# Altium footprint library con-amp.PCBLIB: 295 footprints (part 10 of 19)
Each footprint in its own frame and in the unit in brackets; x right, y up, seen from the top. Pads: shape width x height; smd on the part's side, far side on the other; paste and mask are expansions set on the pad; w line width, h text height; cw(c..) or ccw(c..) is an arc to the next point about the centre after c.
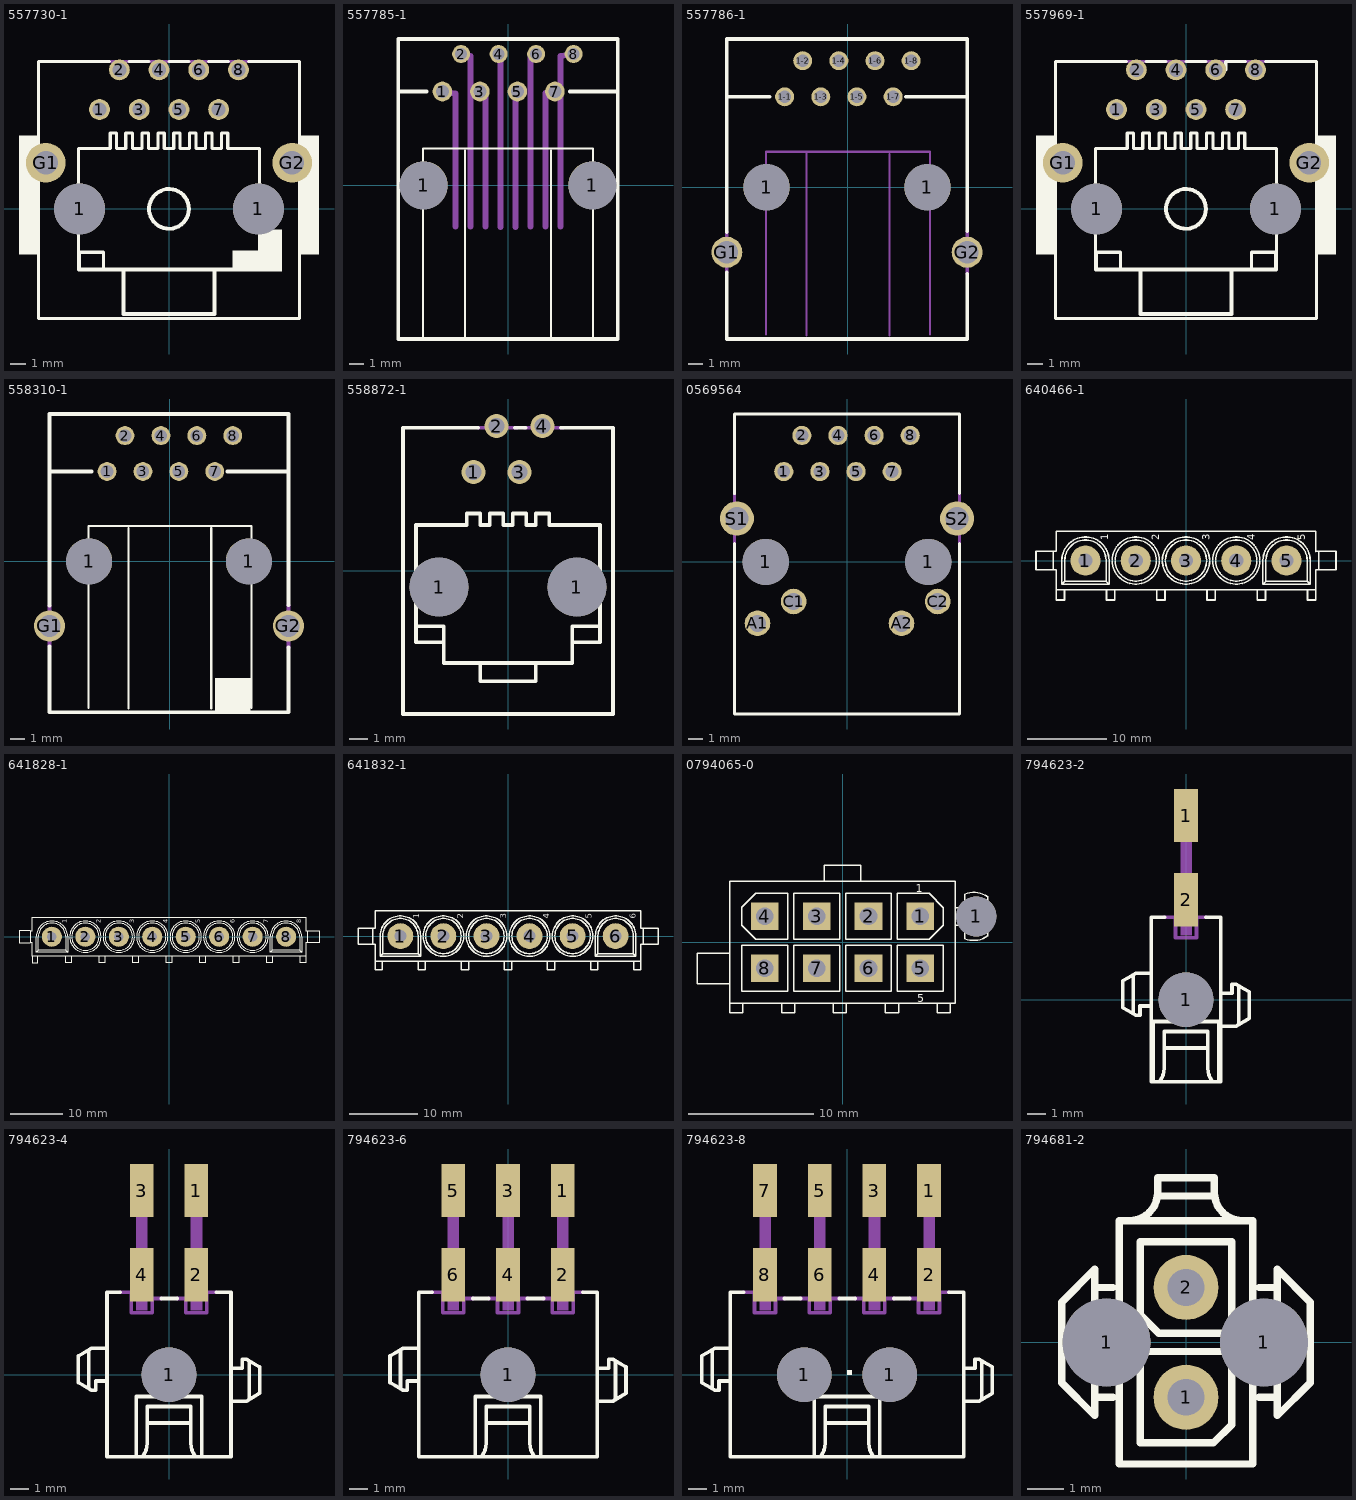
[diagram p9: the footprints below, top view; thin cyan lines are the x and y axes]

## 557730-1 [mil]
pads (12):
  round 128 hole 128: 1(-225,0) 1(225,0)
  round 52.5 hole 35: 1(-175,250) 2(-125,350) 3(-75,250) 4(-25,350) 5(25,250) 6(75,350) 7(125,250) 8(175,350)
  round 100 hole 60: G1(-310,116) G2(310,116)
Top Overlay:
  circle w10: c0,0 r50
  rectangle: -377.56,-114.61 -326.38,184.61
  rectangle: 326.38,-114.61 377.56,184.61
  rectangle: 160,-157 232,-105
  rectangle: 230,-157 284,-52
  lines w8: -165,-152 -165,-109 -228,-109 -228,152 -148,152 -148,191 -132,191 -132,152 -109,152 -109,191 -92,191 -92,152 -68,152 -68,191 -52,191 -52,152 -28,152 -28,191 -12,191 -12,152 12,152 12,191 28,191 28,152 52,152 52,191 68,191 68,152 92,152 92,191 108,191 108,152 132,152 132,191 148,191 148,152 228,152 228,-109 ; -150,371.02 -328.35,371.02 -328.35,-276.02 328.35,-276.02 328.35,371.02 200,371.02 ; -100,371.02 -50,371.02 ; 0,371.02 50,371.02 ; 100,371.02 150,371.02
  lines w10: -227,-110 -227,-152 227,-152 227,-111 ; -115,-154 -115,-264 115,-264 115,-154
Mechanical 16:
  lines w8: -150,371.02 -100,371.02 ; -50,371.02 0,371.02 ; 50,371.02 100,371.02 ; 150,371.02 200,371.02

## 557785-1 [mil]
pads (10):
  round 128 hole 128: 1(-225,0) 1(225,0)
  round 52.5 hole 35: 1(-175,250) 3(-75,250) 5(25,250) 7(125,250)
  round 48 hole 32: 2(-125,350) 4(-25,350) 6(75,350) 8(175,350)
Top Overlay:
  lines w6: -227,-408 -227,98 227,98 227,-408 ; -115,-410 -115,93 ; 115,-410 115,92
  lines w10: -217,250 -293,250 ; 165,250 293,250 ; -293,250 -293,390 293,390 293,250 ; -293,250 -293,-410 -115,-410 115,-410 293,-410 293,250
Mechanical 16:
  lines w16: -175,250 -140,245 -140,-110 ; -125,349 -100,345 -100,-110 ; -75,250 -60,247 ; -60,-110 -60,245 ; -25,350 -20,349 ; -20,-111 -20,345 ; 20,-111 20,245 ; 20,248 25,250 ; 60,-110 60,345 ; 60,347 75,350 ; 100,-110 100,245 ; 100,246 125,250 ; 140,-110 140,345 175,350

## 557786-1 [mil]
pads (12):
  round 128 hole 128: 1(-225,0) 1(220,0)
  round 52.5 hole 35: 1-1(-175,250) 1-2(-125,350) 1-3(-75,250) 1-4(-25,350) 1-5(25,250) 1-6(75,350) 1-7(125,250) 1-8(175,350)
  round 86 hole 62: G1(-335,-180) G2(330,-180)
Top Overlay:
  lines w10: -335,-236 -335,-420 330,-420 330,-239 ; -335,-124 -335,250 ; -217,250 -335,250 ; 160,250 330,250 ; 330,-122 330,250 ; -335,250 -335,410 330,410 330,250
Mechanical 16:
  lines w6: -227,-408 -227,98 227,98 227,-408 ; -115,-410 -115,93 ; 115,-410 115,92
  lines w10: -335,-235 -335,-124 ; 330,-240 330,-122

## 557969-1 [mil]
pads (12):
  round 128 hole 128: 1(-225,0) 1(225,0)
  round 52.5 hole 35: 1(-175,250) 2(-125,350) 3(-75,250) 4(-25,350) 5(25,250) 6(75,350) 7(125,250) 8(175,350)
  round 100 hole 60: G1(-310,116) G2(310,116)
Top Overlay:
  circle w10: c0,0 r50
  rectangle: -377.56,-114.61 -326.38,184.61
  rectangle: 326.38,-114.61 377.56,184.61
  lines w8: -165,-152 -165,-109 -228,-109 -228,152 -148,152 -148,191 -132,191 -132,152 -109,152 -109,191 -92,191 -92,152 -68,152 -68,191 -52,191 -52,152 -28,152 -28,191 -12,191 -12,152 12,152 12,191 28,191 28,152 52,152 52,191 68,191 68,152 92,152 92,191 108,191 108,152 132,152 132,191 148,191 148,152 228,152 228,-109 165,-109 165,-152 ; -150,371.02 -328.35,371.02 -328.35,-276.02 328.35,-276.02 328.35,371.02 200,371.02 ; -100,371.02 -50,371.02 ; 0,371.02 50,371.02 ; 100,350 100,371.02 150,371.02
  lines w10: -227,-110 -227,-152 227,-152 227,-111 ; -115,-154 -115,-264 115,-264 115,-154
Mechanical 16:
  lines w8: -150,371.02 -100,371.02 ; -50,371.02 0,371.02 ; 50,371.02 100,371.02 ; 150,371.02 200,371.02

## 558310-1 [mil]
pads (12):
  round 128 hole 128: 1(-225,0) 1(220,0)
  round 52.5 hole 35: 1(-175,250) 2(-125,350) 3(-75,250) 4(-25,350) 5(25,250) 6(75,350) 7(125,250) 8(175,350)
  round 86 hole 62: G1(-335,-180) G2(330,-180)
Top Overlay:
  rectangle: 125,-425 225,-325
  lines w6: -227,-408 -227,98 227,98 227,-408 ; -115,-410 -115,93 ; 115,-410 115,92
  lines w10: -335,-236 -335,-420 330,-420 330,-239 ; -335,-124 -335,250 ; -217,250 -335,250 ; 160,250 330,250 ; 330,-122 330,250 ; -335,250 -335,410 330,410 330,250
Mechanical 16:
  lines w10: -335,-235 -335,-124 ; 330,-240 330,-122

## 558872-1 [mil]
pads (6):
  round 128 hole 128: 1(-150,-35) 1(150,-35)
  round 52.5 hole 35: 1(-75,215) 2(-25,315) 3(25,215) 4(75,315)
Top Overlay:
  lines w8: -65,311.02 -228.35,311.02 -228.35,-311.02 228.35,-311.02 228.35,311.02 115,311.02 ; 15,311.02 38.35,311.02 ; -200,-120 -200,100 -90,100 -90,125 -60,125 -60,100 -40,100 -40,125 -10,125 -10,100 10,100 10,125 40,125 40,100 60,100 60,125 90,125 90,100 200,100 200,-120 ; -200,-120 -200,-155 -140,-155 ; -200,-120 -140,-120 -140,-155 ; -140,-155 -140,-200 -60,-200 ; -60,-200 60,-200 ; -60,-200 -60,-240 60,-240 60,-200 ; 60,-200 140,-200 140,-155 ; 140,-155 200,-155 200,-120 ; 140,-155 140,-120 200,-120
Mechanical 16:
  lines w8: -65,311.02 20,311.02 ; 35,311.02 120,311.02

## 0569564 [mil]
pads (16):
  round 127.95 hole 127.95: 1(-225,0) 1(225,0)
  round 53.15 hole 35.43: 1(-175,250) 2(-125,350) 3(-75,250) 4(-25,350) 5(25,250) 6(75,350) 7(125,250) 8(175,350)
  round 70.86 hole 47.24: A1(-247.83,-170.08) A2(150.98,-170.08) C1(-147.83,-109.84) C2(250.98,-109.84)
  round 94.48 hole 62.99: S1(-304.92,120.08) S2(304.92,120.08)
Top Overlay:
  lines w8: -311.02,50.79 -311.02,-421.26 311.02,-421.26 311.02,51.18 ; -311.02,188.58 -311.02,409.45 311.02,409.45 311.02,188.98
Mechanical 16:
  lines w8: -311.02,51.18 -311.02,188.98 ; 311.02,51.18 311.02,188.98

## 640466-1 [mil]
pads (5):
  round 150 hole 70.87: 1(-500,0) 2(-250,0) 3(0,0) 4(250,0) 5(500,0)
Top Overlay:
  lines w8: -660.43,-46.26 -746.06,-46.26 -746.06,46.26 -660.43,46.26 ; -645.67,-146.65 -645.67,-195.87 -604.33,-195.87 -604.33,-149.61 ; -617.49,0 -617.49,-117.5 ; -617.5,2.5 cw(c-500,-0.21) -382.51,2.5 -382.51,0 ; -602.49,0 -602.49,-102.5 ; -602.5,2.5 cw(c-500,-0.1) -397.51,2.5 -397.51,0 -397.49,-102.5 ; -395.67,-148.62 -395.67,-195.87 -354.33,-195.87 -354.33,-148.62 ; -367.49,-2.5 ccw(c-249.99,0.21) -132.49,-2.5 ; -367.51,2.5 cw(c-250.01,-0.21) -132.51,2.5 ; -352.49,-2.5 ccw(c-249.99,0.17) -147.49,-2.5 ; -352.51,2.5 cw(c-250.01,-0.17) -147.51,2.5 ; -145.67,-148.62 -145.67,-195.87 -104.33,-195.87 -104.33,-148.62 ; -117.49,-2.5 ccw(c0.01,0.21) 117.51,-2.5 ; -117.51,2.5 cw(c-0.01,-0.21) 117.49,2.5 ; -102.49,-2.5 ccw(c0.01,0.17) 102.51,-2.5 ; -102.51,2.5 cw(c-0.01,-0.17) 102.49,2.5 ; 104.33,-148.62 104.33,-195.87 145.67,-195.87 145.67,-148.62 ; 132.51,-2.5 ccw(c250.01,0.21) 367.51,-2.5 ; 132.49,2.5 cw(c249.99,-0.21) 367.49,2.5 ; 147.51,-2.5 ccw(c250.01,0.17) 352.51,-2.5 ; 147.49,2.5 cw(c249.99,-0.17) 352.49,2.5 ; 354.33,-148.62 354.33,-195.87 395.67,-195.87 395.67,-148.62 ; 602.5,0 602.5,-102.5 ; 602.49,2.5 ccw(c499.99,-0.17) 397.49,2.5 397.49,0 397.51,-102.5 ; 604.33,-150.59 604.33,-195.87 645.67,-195.87 645.67,-147.64 ; 617.5,0 617.5,-117.5 ; 617.49,2.5 ccw(c499.99,-0.21) 382.49,2.5 382.49,0 382.51,-117.5 ; 645.67,45.28 645.67,46.26 ; 660.43,-46.26 746.06,-46.26 746.06,46.26 660.43,46.26 ; -617.49,-117.5 -602.49,-102.5 ; -617.49,-117.5 -382.49,-117.5 ; -602.49,-102.5 -397.49,-102.5 ; -397.49,-102.5 -382.49,-117.5 ; -382.49,-117.5 -382.49,0 ; -382.49,0 -382.51,0 ; 382.51,-117.5 617.5,-117.5 ; 382.51,-117.5 397.51,-102.5 ; 397.51,-102.5 602.5,-102.5 ; 602.5,-102.5 617.5,-117.5 ; 645.67,46.26 645.67,145.67 -645.67,145.67 -645.67,46.26 -659.45,46.26 -659.45,-46.26 -645.67,-46.26 -645.67,-145.67 645.67,-145.67 645.67,-46.26 659.45,-46.26 659.45,46.26 645.67,46.26
  text "1" at -375,100 h62
  text "2" at -120,100 h62
  text "3" at 130,100 h62
  text "4" at 355,100 h62
  text "5" at 605,100 h62
Mechanical 16:
  circle w8: c500,0 r62.5
  circle w8: c-500,0 r62.51
  circle w8: c-250,0 r62.5
  circle w8: c0,0 r62.5
  circle w8: c250,0 r62.5

## 641828-1 [mil]
pads (8):
  round 150 hole 70.87: 1(-875,0) 2(-625,0) 3(-375,0) 4(-125,0) 5(125,0) 6(375,0) 7(625,0) 8(875,0)
Top Overlay:
  lines w8: -1035.43,-46.26 -1121.06,-46.26 -1121.06,46.26 -1035.43,46.26 ; -1020.67,-146.65 -1020.67,-195.87 -979.33,-195.87 -979.33,-149.61 ; -992.49,0 -992.49,-117.5 ; -992.5,2.5 cw(c-875,-0.21) -757.51,2.5 -757.51,0 ; -977.49,0 -977.49,-102.5 ; -977.5,2.5 cw(c-875,-0.1) -772.51,2.5 -772.51,0 -772.49,-102.5 ; -770.67,-148.62 -770.67,-195.87 -729.33,-195.87 -729.33,-148.62 ; -742.49,-2.5 ccw(c-624.99,0.21) -507.49,-2.5 ; -742.51,2.5 cw(c-625.01,-0.21) -507.51,2.5 ; -727.49,-2.5 ccw(c-624.99,0.17) -522.49,-2.5 ; -727.51,2.5 cw(c-625.01,-0.17) -522.51,2.5 ; -520.67,-148.62 -520.67,-195.87 -479.33,-195.87 -479.33,-148.62 ; -492.49,-2.5 ccw(c-374.99,0.21) -257.49,-2.5 ; -492.51,2.5 cw(c-375.01,-0.21) -257.51,2.5 ; -477.49,-2.5 ccw(c-374.99,0.17) -272.49,-2.5 ; -477.51,2.5 cw(c-375.01,-0.17) -272.51,2.5 ; -270.67,-148.62 -270.67,-195.87 -229.33,-195.87 -229.33,-148.62 ; -242.49,-2.5 ccw(c-124.99,0.21) -7.49,-2.5 ; -242.51,2.5 cw(c-125.01,-0.21) -7.51,2.5 ; -227.49,-2.5 ccw(c-124.99,0.17) -22.49,-2.5 ; -227.51,2.5 cw(c-125.01,-0.17) -22.51,2.5 ; -20.67,-148.62 -20.67,-195.87 20.67,-195.87 20.67,-148.62 ; 7.51,-2.5 ccw(c125.01,0.21) 242.51,-2.5 ; 7.49,2.5 cw(c124.99,-0.21) 242.49,2.5 ; 22.51,-2.5 ccw(c125.01,0.17) 227.51,-2.5 ; 22.49,2.5 cw(c124.99,-0.17) 227.49,2.5 ; 229.33,-148.62 229.33,-195.87 270.67,-195.87 270.67,-148.62 ; 257.51,-2.5 ccw(c375.01,0.21) 492.51,-2.5 ; 257.49,2.5 cw(c374.99,-0.21) 492.49,2.5 ; 272.51,-2.5 ccw(c375.01,0.17) 477.51,-2.5 ; 272.49,2.5 cw(c374.99,-0.17) 477.49,2.5 ; 479.33,-148.62 479.33,-195.87 520.67,-195.87 520.67,-148.62 ; 507.51,-2.5 ccw(c625.01,0.21) 742.51,-2.5 ; 507.49,2.5 cw(c624.99,-0.21) 742.49,2.5 ; 522.51,-2.5 ccw(c625.01,0.17) 727.51,-2.5 ; 522.49,2.5 cw(c624.99,-0.17) 727.49,2.5 ; 729.33,-148.62 729.33,-195.87 770.67,-195.87 770.67,-148.62 ; 977.5,0 977.5,-102.5 ; 977.49,2.5 ccw(c874.99,-0.17) 772.49,2.5 772.49,0 772.51,-102.5 ; 979.33,-150.59 979.33,-195.87 1020.67,-195.87 1020.67,-147.64 ; 992.5,0 992.5,-117.5 ; 992.49,2.5 ccw(c874.99,-0.21) 757.49,2.5 757.49,0 757.51,-117.5 ; 1020.67,45.28 1020.67,46.26 ; 1035.43,-46.26 1121.06,-46.26 1121.06,46.26 1035.43,46.26 ; -992.49,-117.5 -977.49,-102.5 ; -992.49,-117.5 -757.49,-117.5 ; -977.49,-102.5 -772.49,-102.5 ; -772.49,-102.5 -757.49,-117.5 ; -757.49,-117.5 -757.49,0 ; -757.49,0 -757.51,0 ; 757.51,-117.5 992.5,-117.5 ; 757.51,-117.5 772.51,-102.5 ; 772.51,-102.5 977.5,-102.5 ; 977.5,-102.5 992.5,-117.5 ; 1020.67,46.26 1020.67,145.67 -1020.67,145.67 -1020.67,46.26 -1034.45,46.26 -1034.45,-46.26 -1020.67,-46.26 -1020.67,-145.67 1020.67,-145.67 1020.67,-46.26 1034.45,-46.26 1034.45,46.26 1020.67,46.26 ; 242.51,0 242.49,0
  text "1" at -750,100 h62
  text "2" at -495,100 h62
  text "3" at -245,100 h62
  text "4" at 5,100 h62
  text "5" at 250,100 h62
  text "6" at 505,100 h62
  text "7" at 755,100 h62
  text "8" at 1005,100 h62
Mechanical 16:
  circle w8: c-125,0 r62.5
  circle w8: c-875,0 r62.51
  circle w8: c-625,0 r62.5
  circle w8: c-375,0 r62.5
  circle w8: c875,0 r62.5
  circle w8: c125,0 r62.51
  circle w8: c375,0 r62.5
  circle w8: c625,0 r62.5

## 641832-1 [mil]
pads (6):
  round 150 hole 70.87: 1(-625,0) 2(-375,0) 3(-125,0) 4(125,0) 5(375,0) 6(625,0)
Top Overlay:
  lines w8: -785.43,-46.26 -871.06,-46.26 -871.06,46.26 -785.43,46.26 ; -770.67,-146.65 -770.67,-195.87 -729.33,-195.87 -729.33,-149.61 ; -742.49,0 -742.49,-117.5 ; -742.5,2.5 cw(c-625,-0.21) -507.51,2.5 -507.51,0 ; -727.49,0 -727.49,-102.5 ; -727.5,2.5 cw(c-625,-0.1) -522.51,2.5 -522.51,0 -522.49,-102.5 ; -520.67,-148.62 -520.67,-195.87 -479.33,-195.87 -479.33,-148.62 ; -492.49,-2.5 ccw(c-374.99,0.21) -257.49,-2.5 ; -492.51,2.5 cw(c-375.01,-0.21) -257.51,2.5 ; -477.49,-2.5 ccw(c-374.99,0.17) -272.49,-2.5 ; -477.51,2.5 cw(c-375.01,-0.17) -272.51,2.5 ; -270.67,-148.62 -270.67,-195.87 -229.33,-195.87 -229.33,-148.62 ; -242.49,-2.5 ccw(c-124.99,0.21) -7.49,-2.5 ; -242.51,2.5 cw(c-125.01,-0.21) -7.51,2.5 ; -227.49,-2.5 ccw(c-124.99,0.17) -22.49,-2.5 ; -227.51,2.5 cw(c-125.01,-0.17) -22.51,2.5 ; -20.67,-148.62 -20.67,-195.87 20.67,-195.87 20.67,-148.62 ; 7.51,-2.5 ccw(c125.01,0.21) 242.51,-2.5 ; 7.49,2.5 cw(c124.99,-0.21) 242.49,2.5 ; 22.51,-2.5 ccw(c125.01,0.17) 227.51,-2.5 ; 22.49,2.5 cw(c124.99,-0.17) 227.49,2.5 ; 229.33,-148.62 229.33,-195.87 270.67,-195.87 270.67,-148.62 ; 257.51,-2.5 ccw(c375.01,0.21) 492.51,-2.5 ; 257.49,2.5 cw(c374.99,-0.21) 492.49,2.5 ; 272.51,-2.5 ccw(c375.01,0.17) 477.51,-2.5 ; 272.49,2.5 cw(c374.99,-0.17) 477.49,2.5 ; 479.33,-148.62 479.33,-195.87 520.67,-195.87 520.67,-148.62 ; 727.5,0 727.5,-102.5 ; 727.49,2.5 ccw(c624.99,-0.17) 522.49,2.5 522.49,0 522.51,-102.5 ; 729.33,-150.59 729.33,-195.87 770.67,-195.87 770.67,-147.64 ; 742.5,0 742.5,-117.5 ; 742.49,2.5 ccw(c624.99,-0.21) 507.49,2.5 507.49,0 507.51,-117.5 ; 770.67,45.28 770.67,46.26 ; 785.43,-46.26 871.06,-46.26 871.06,46.26 785.43,46.26 ; -742.49,-117.5 -727.49,-102.5 ; -742.49,-117.5 -507.49,-117.5 ; -727.49,-102.5 -522.49,-102.5 ; -522.49,-102.5 -507.49,-117.5 ; -507.49,-117.5 -507.49,0 ; -507.49,0 -507.51,0 ; 507.51,-117.5 742.5,-117.5 ; 507.51,-117.5 522.51,-102.5 ; 522.51,-102.5 727.5,-102.5 ; 727.5,-102.5 742.5,-117.5 ; 770.67,46.26 770.67,145.67 -770.67,145.67 -770.67,46.26 -784.45,46.26 -784.45,-46.26 -770.67,-46.26 -770.67,-145.67 770.67,-145.67 770.67,-46.26 784.45,-46.26 784.45,46.26 770.67,46.26 ; 492.51,0 492.49,0
  text "1" at -500,100 h62
  text "2" at -245,100 h62
  text "3" at 5,100 h62
  text "4" at 255,100 h62
  text "5" at 500,100 h62
  text "6" at 755,100 h62
Mechanical 16:
  circle w8: c125,0 r62.5
  circle w8: c-625,0 r62.51
  circle w8: c-375,0 r62.5
  circle w8: c-125,0 r62.5
  circle w8: c625,0 r62.5
  circle w8: c375,0 r62.51

## 0794065-0 [mil]
pads (9):
  rect 86.61x86.61 hole 55.12: 1(244.49,81.5) 2(81.5,81.5) 3(-81.5,81.5) 4(-244.49,81.5) 5(244.49,-81.5) 6(81.5,-81.5) 7(-81.5,-81.5) 8(-244.49,-81.5)
  round 125.98 hole 125.98: 1(419.69,81.5)
Top Overlay:
  lines w4: -153.54,-154.04 -153.54,-153.54 ; -354.33,-191.44 -313.48,-191.44 ; -354.33,-191.44 -354.33,-129.43 ; -354.33,-191.44 -354.33,-221.46 -313.48,-221.46 -313.48,-191.44 ; -354.33,-129.43 -354.33,-33.46 ; -354.33,-129.43 -456.69,-129.43 -456.69,-33.46 -354.33,-33.46 ; -354.33,-33.46 -354.33,191.44 -57.09,191.44 ; -313.48,-191.44 -191.44,-191.44 ; -191.44,-191.44 -150.59,-191.44 ; -191.44,-191.44 -191.44,-221.46 -150.59,-221.46 -150.59,-191.44 ; -153.54,-153.54 -153.54,-9.35 -9.35,-9.35 -9.35,-153.54 -153.54,-153.54 ; -150.59,-191.44 -28.54,-191.44 ; -57.09,191.44 57.09,191.44 ; -57.09,191.44 -57.09,242.62 57.09,242.62 57.09,191.44 ; -28.54,-191.44 12.3,-191.44 ; -28.54,-191.44 -28.54,-221.46 12.3,-221.46 12.3,-191.44 ; 12.3,-191.44 134.35,-191.44 ; 57.09,191.44 354.33,191.44 354.33,109.25 ; 134.35,-191.44 175.69,-191.44 ; 134.35,-191.44 134.35,-221.46 175.69,-221.46 175.69,-191.44 ; 175.69,-191.44 297.74,-191.44 ; 297.74,-191.44 338.58,-191.44 ; 297.74,-191.44 297.74,-221.46 338.58,-221.46 338.58,-191.44 ; 338.58,-191.44 354.33,-191.44 354.33,53.64 ; 354.33,53.64 354.33,109.25 ; 354.33,53.64 383.37,53.64 383.37,54.13 ; 354.33,109.25 383.37,109.25 383.37,108.76 ; 383.37,54.13 383.37,108.76 ; 383.37,54.13 383.37,11.81 ccw(c412,78.65) 455.22,20.18 455.22,142.72 ccw(c411.52,84) 383.37,151.57 383.37,108.76 ; -316.44,-153.54 -316.44,-9.35 -172.24,-9.35 -172.24,-153.54 -316.44,-153.54 ; -316.44,53.64 -272.15,9.35 -172.24,9.35 -172.24,153.54 -272.64,153.54 -316.44,109.74 -316.44,53.64 ; -153.54,9.35 -9.35,9.35 -9.35,153.54 -153.54,153.54 -153.54,9.35 ; 9.35,-153.54 9.35,-9.35 153.54,-9.35 153.54,-153.54 9.35,-153.54 ; 9.35,9.35 153.54,9.35 153.54,153.54 9.35,153.54 9.35,9.35 ; 172.24,-153.54 172.24,-9.35 316.44,-9.35 316.44,-153.54 172.24,-153.54 ; 172.24,9.35 272.15,9.35 316.44,53.64 316.44,109.25 272.15,153.54 172.24,153.54 172.24,9.35
  text "1" at 230.32,157.97 h25.1
  text "5" at 234.74,-187.5 h25.1

## 794623-2 [mm]
pads (3):
  round 3 hole 3: 1(0,0)
  rect 1.3x2.92 smd: 1(0,10.1) 2(0,5.48)
Top Overlay:
  region: 0,0 0.254,0 0.254,0.254 0,0.254
  region: 0,0 0.254,0 0.254,0.254 0,0.254
  region: 0,0 0.254,0 0.254,0.254 0,0.254
  region: 0,0 0.254,0 0.254,0.254 0,0.254
  lines w0.203: -2.9,-0.7 -2.9,1.3 ; -2,-0.35 -2.525,-0.35 -2.525,-0.85 -2.75,-0.85 -3.475,-0.425 -3.475,1.025 -2.75,1.45 -2,1.45 ; -1.8,-4.4 -1.8,-1.2 1.8,-1.2 1.8,-4.4 ; -1.425,-4.45 ccw(c-2.325,-3.775) -1.2,-3.775 -1.2,-2.65 ; -1.175,4.525 -1.9,4.525 -1.9,-4.5 1.9,-4.5 1.9,4.525 1.1,4.525 ; 1.425,-4.45 cw(c2.325,-3.775) 1.2,-3.775 1.2,-2.65 ; 2,-1.45 2.75,-1.45 3.475,-1.025 3.475,0.425 2.75,0.85 2.525,0.85 2.525,0.35 2,0.35 ; 2.9,-1.3 2.9,0.7 ; -1.2,-2.65 1.2,-2.65 ; -1.2,-2.65 -1.2,-1.75 1.2,-1.75 1.2,-2.65
Mechanical 16:
  rectangle: -0.312,3.513 0.325,11.025
  lines w0.203: -1.175,4.525 -0.575,4.525 -0.575,3.4 0.575,3.4 0.575,4.525 1.1,4.525

## 794623-4 [mm]
pads (5):
  round 3 hole 3: 1(0,0)
  rect 1.3x2.92 smd: 1(1.5,10.1) 2(1.5,5.48) 3(-1.5,10.1) 4(-1.5,5.48)
Top Overlay:
  region: 0,0 0.254,0 0.254,0.254 0,0.254
  region: 0,0 0.254,0 0.254,0.254 0,0.254
  region: 0,0 0.254,0 0.254,0.254 0,0.254
  region: 0,0 0.254,0 0.254,0.254 0,0.254
  lines w0.203: -4.4,-0.7 -4.4,1.3 ; -3.5,-0.35 -4.025,-0.35 -4.025,-0.85 -4.25,-0.85 -4.975,-0.425 -4.975,1.025 -4.25,1.45 -3.5,1.45 ; -2.675,4.525 -3.4,4.525 -3.4,-4.5 3.4,-4.5 3.4,4.525 2.6,4.525 ; -1.8,-4.4 -1.8,-1.2 1.8,-1.2 1.8,-4.4 ; -1.425,-4.45 ccw(c-2.325,-3.775) -1.2,-3.775 -1.2,-2.65 ; -0.425,4.175 0.45,4.175 ; 1.425,-4.45 cw(c2.325,-3.775) 1.2,-3.775 1.2,-2.65 ; 3.5,-1.45 4.25,-1.45 4.975,-1.025 4.975,0.425 4.25,0.85 4.025,0.85 4.025,0.35 3.5,0.35 ; 4.4,-1.3 4.4,0.7 ; -1.2,-2.65 1.2,-2.65 ; -1.2,-2.65 -1.2,-1.75 1.2,-1.75 1.2,-2.65
Mechanical 16:
  rectangle: 1.187,3.513 1.825,11.025
  rectangle: -1.813,3.513 -1.175,11.025
  lines w0.203: -2.675,4.525 -2.075,4.525 -2.075,3.4 -0.925,3.4 -0.925,4.175 -0.425,4.175 ; 0.45,4.175 0.925,4.175 0.925,3.4 2.075,3.4 2.075,4.525 2.6,4.525

## 794623-6 [mm]
pads (7):
  round 3 hole 3: 1(0,0)
  rect 1.3x2.92 smd: 1(3,10.1) 2(3,5.48) 3(0,10.1) 4(0,5.48) 5(-3,10.1) 6(-3,5.48)
Top Overlay:
  region: 0,0 0.254,0 0.254,0.254 0,0.254
  region: 0,0 0.254,0 0.254,0.254 0,0.254
  region: 0,0 0.254,0 0.254,0.254 0,0.254
  region: 0,0 0.254,0 0.254,0.254 0,0.254
  lines w0.203: -5.9,-0.7 -5.9,1.3 ; -5,-0.35 -5.525,-0.35 -5.525,-0.85 -5.75,-0.85 -6.475,-0.425 -6.475,1.025 -5.75,1.45 -5,1.45 ; -4.175,4.525 -4.9,4.525 -4.9,-4.5 4.9,-4.5 4.9,4.525 4.1,4.525 ; -1.925,4.175 -1.05,4.175 ; -1.8,-4.4 -1.8,-1.2 1.8,-1.2 1.8,-4.4 ; -1.425,-4.45 ccw(c-2.325,-3.775) -1.2,-3.775 -1.2,-2.65 ; 1.075,4.175 1.95,4.175 ; 1.425,-4.45 cw(c2.325,-3.775) 1.2,-3.775 1.2,-2.65 ; 5,-1.45 5.75,-1.45 6.475,-1.025 6.475,0.425 5.75,0.85 5.525,0.85 5.525,0.35 5,0.35 ; 5.9,-1.3 5.9,0.7 ; -1.2,-2.65 1.2,-2.65 ; -1.2,-2.65 -1.2,-1.75 1.2,-1.75 1.2,-2.65
Mechanical 16:
  rectangle: 2.688,3.513 3.325,11.025
  rectangle: -0.312,3.513 0.325,11.025
  rectangle: -3.312,3.513 -2.675,11.025
  lines w0.203: -4.175,4.525 -3.575,4.525 -3.575,3.4 -2.425,3.4 -2.425,4.175 -1.925,4.175 ; -1.05,4.175 -0.575,4.175 -0.575,3.4 0.575,3.4 0.575,4.175 1.075,4.175 ; 1.95,4.175 2.425,4.175 2.425,3.4 3.575,3.4 3.575,4.525 4.1,4.525

## 794623-8 [mm]
pads (10):
  round 3 hole 3: 1(-2.35,0) 1(2.35,0)
  rect 1.3x2.92 smd: 1(4.5,10.1) 2(4.5,5.48) 3(1.5,10.1) 4(1.5,5.48) 5(-1.5,10.1) 6(-1.5,5.48) 7(-4.5,10.1) 8(-4.5,5.48)
Top Overlay:
  region: 0,0 0.254,0 0.254,0.254 0,0.254
  region: 0,0 0.254,0 0.254,0.254 0,0.254
  region: 0,0 0.254,0 0.254,0.254 0,0.254
  region: 0,0 0.254,0 0.254,0.254 0,0.254
  lines w0.203: -7.4,-0.7 -7.4,1.3 ; -6.5,-0.35 -7.025,-0.35 -7.025,-0.85 -7.25,-0.85 -7.975,-0.425 -7.975,1.025 -7.25,1.45 -6.5,1.45 ; -5.675,4.525 -6.4,4.525 -6.4,-4.5 6.4,-4.5 6.4,4.525 5.6,4.525 ; -3.425,4.175 -2.55,4.175 ; -1.8,-4.4 -1.8,-1.2 1.8,-1.2 1.8,-4.4 ; -1.425,-4.45 ccw(c-2.325,-3.775) -1.2,-3.775 -1.2,-2.65 ; -0.425,4.175 0.45,4.175 ; 1.425,-4.45 cw(c2.325,-3.775) 1.2,-3.775 1.2,-2.65 ; 2.575,4.175 3.45,4.175 ; 6.5,-1.45 7.25,-1.45 7.975,-1.025 7.975,0.425 7.25,0.85 7.025,0.85 7.025,0.35 6.5,0.35 ; 7.4,-1.3 7.4,0.7 ; -1.2,-2.65 1.2,-2.65 ; -1.2,-2.65 -1.2,-1.75 1.2,-1.75 1.2,-2.65
Mechanical 16:
  rectangle: 4.187,3.513 4.825,11.025
  rectangle: 1.187,3.513 1.825,11.025
  rectangle: -1.813,3.513 -1.175,11.025
  rectangle: -4.813,3.513 -4.175,11.025
  lines w0.203: -5.675,4.525 -5.075,4.525 -5.075,3.4 -3.925,3.4 -3.925,4.175 -3.425,4.175 ; -2.55,4.175 -2.075,4.175 -2.075,3.4 -0.925,3.4 -0.925,4.175 -0.425,4.175 ; 0.45,4.175 0.925,4.175 0.925,3.4 2.075,3.4 2.075,4.175 2.575,4.175 ; 3.45,4.175 3.925,4.175 3.925,3.4 5.075,3.4 5.075,4.525 5.6,4.525

## 794681-2 [mil]
pads (4):
  round 94.49 hole 94.49: 1(-85.43,0) 1(83.86,0)
  round 70 hole 39.37: 1(0,-59.06) 2(0,59.06)
Top Overlay:
  lines w8: -78.74,-59.06 -98.43,-59.06 ; -78.74,59.06 -98.43,59.06 ; -61.02,130.91 ccw(c-61.02,161.42) -30.51,161.42 -30.51,177.17 30.51,177.17 30.51,161.42 ccw(c61.02,161.42) 61.02,130.91 ; -29.53,157.48 29.53,157.48 ; 78.74,-59.06 98.43,-59.06 ; 78.74,59.06 98.43,59.06 ; -98.43,-59.06 -98.43,59.06 ; -98.43,-59.06 -98.43,-78.74 -133.86,-43.31 -133.86,43.31 -98.43,78.74 -98.43,59.06 ; 98.43,-59.06 98.43,59.06 ; 98.43,-59.06 98.43,-78.74 133.86,-43.31 133.86,43.31 98.43,78.74 98.43,59.06 ; -71.85,-130.91 71.85,-130.91 71.85,130.91 -71.85,130.91 -71.85,-130.91 ; -49.21,-108.27 -49.21,-9.84 49.21,-9.84 49.21,-88.58 29.53,-108.27 -49.21,-108.27 ; -49.21,29.53 -49.21,108.27 49.21,108.27 49.21,9.84 -29.53,9.84 -49.21,29.53